# Altium footprint library Hare_Library.PcbLib: 252 footprints (part 1 of 16)
Each footprint in its own frame and in the unit in brackets; x right, y up, seen from the top. Pads: shape width x height; smd on the part's side, far side on the other; paste and mask are expansions set on the pad; w line width, h text height; cw(c..) or ccw(c..) is an arc to the next point about the centre after c.
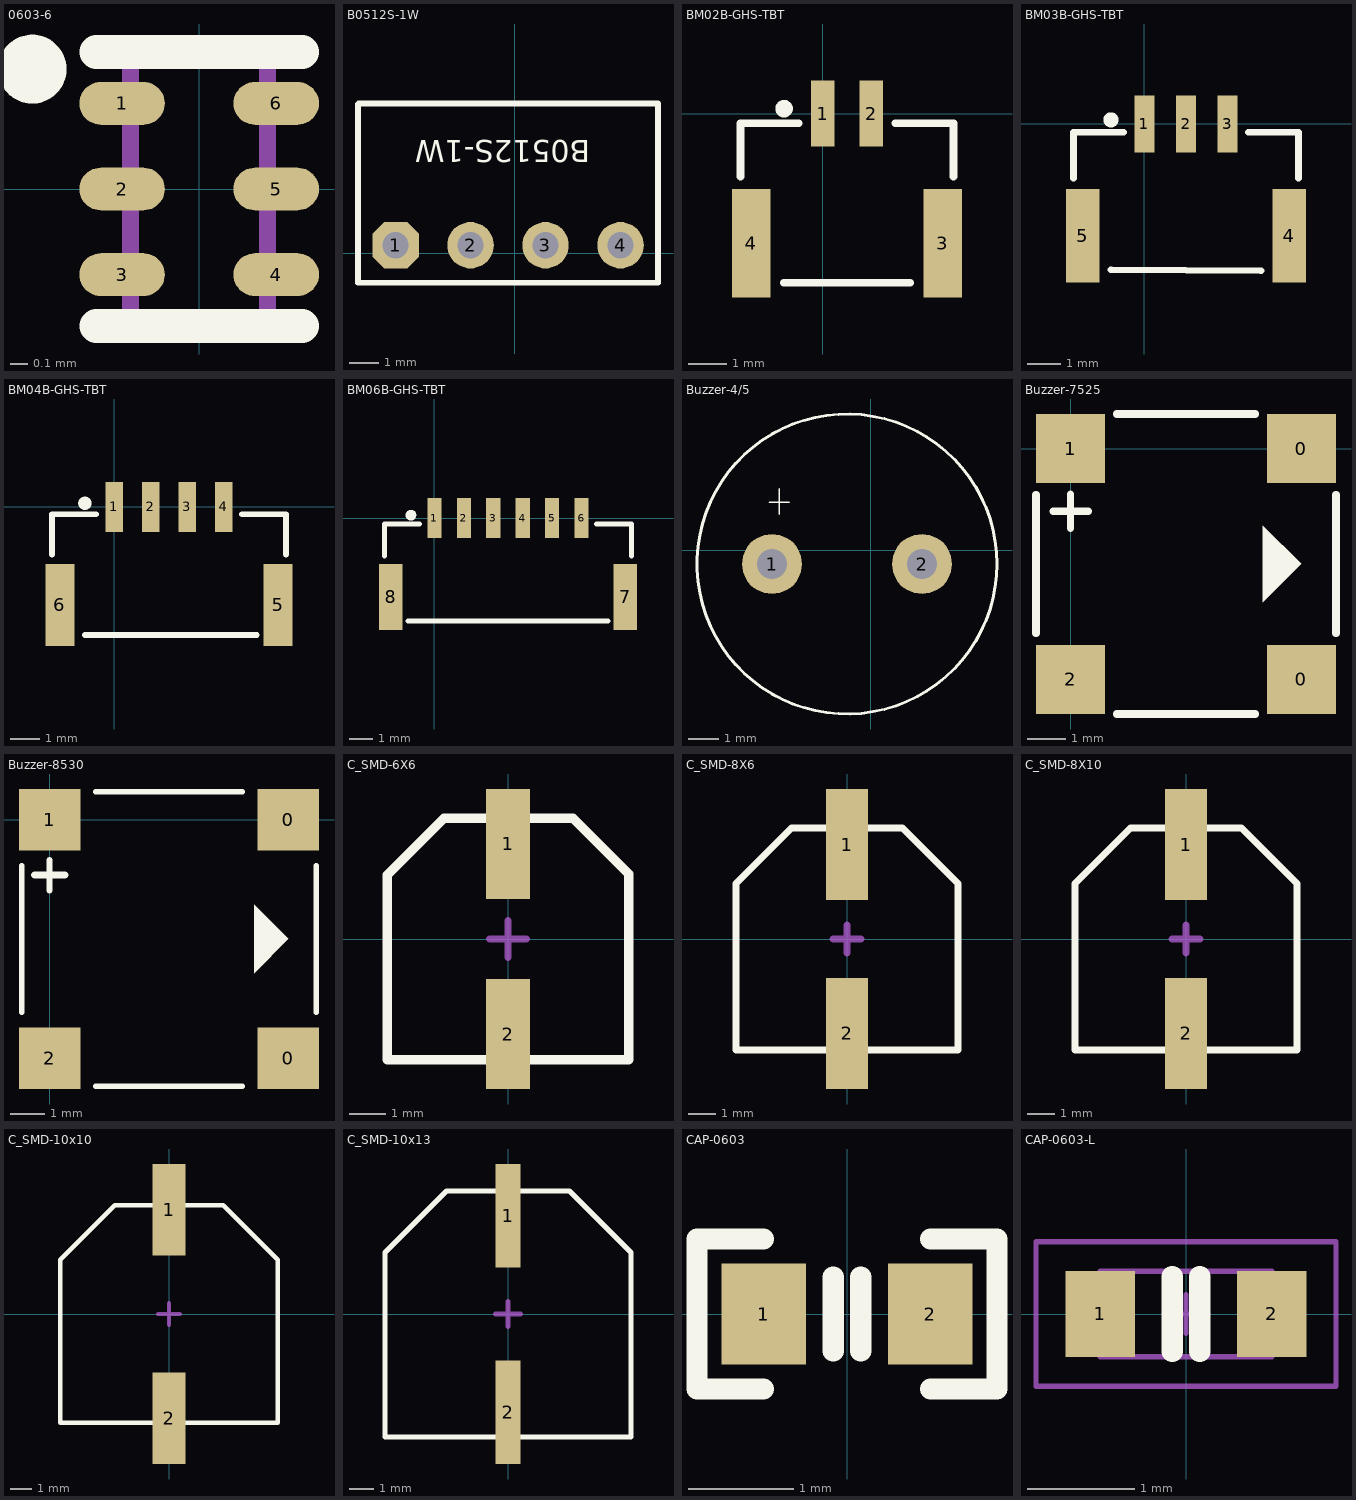
[diagram p0: the footprints below, top view; thin cyan lines are the x and y axes]

## 0603-6 [mm]
pads (6):
  oval 0.5x0.25 smd: 1(-0.45,0.5) 2(-0.45,0) 3(-0.45,-0.5) 4(0.45,-0.5) 5(0.45,0) 6(0.45,0.5)
Top Overlay:
  circle w0.25: c-0.976,0.7 r0.076
  lines w0.2: -0.6,-0.8 0.6,-0.8 ; -0.6,0.8 0.6,0.8
Mechanical 13:
  lines w0.1: -0.4,-0.8 -0.4,0.8 0.4,0.8 0.4,-0.8 -0.4,-0.8

## B0512S-1W [mil]
pads (4):
  oct 62x62 hole 35: 1(-159,11)
  round 62 hole 35: 2(-59,11) 3(41,11) 4(141,11)
Top Overlay:
  lines w7.87: -209,-39 -209,199 -208,200 191,200 191,-39
  lines w8: -209,-39 191,-39
  text "B0512S-1W" at 101,161 h50

## BM02B-GHS-TBT [mm] "GH02立式"
height 4.05
pads (4):
  rect 0.6x1.7 smd: 1(0,0) 2(1.25,0)
  rect 1x2.8 smd: 3(3.1,-3.35) 4(-1.85,-3.35)
Top Overlay:
  circle w0.254: c-1,0.125 r0.1
  lines w0.2: -2.125,-1.625 -2.125,-0.25 -0.625,-0.25 ; -1,-4.375 2.25,-4.375 ; 1.875,-0.25 3.375,-0.25 3.375,-1.625
3D body "BM02B-GHS-TBT.STEP": height 4.18, standoff -0.03, extent -2.25,-4.45 3.5,0.5

## BM03B-GHS-TBT [mm] "GH03立式"
height 4.05
pads (5):
  rect 0.6x1.7 smd: 1(0,0) 2(1.25,0) 3(2.5,0)
  rect 1x2.8 smd: 4(4.35,-3.35) 5(-1.85,-3.35)
Top Overlay:
  circle w0.254: c-1,0.125 r0.1
  lines w0.2: -2.125,-1.625 -2.125,-0.25 -0.625,-0.25 ; -1,-4.375 3.5,-4.4 ; 3.125,-0.25 4.625,-0.25 4.625,-1.625
3D body "BM03B-GHS-TBT.STEP": height 4.18, standoff -0.03, extent -2.25,-4.45 4.75,0.5

## BM04B-GHS-TBT [mm] "GH04立式"
height 4.05
pads (6):
  rect 0.6x1.7 smd: 1(0,0) 2(1.25,0) 3(2.5,0) 4(3.75,0)
  rect 1x2.8 smd: 5(5.6,-3.35) 6(-1.85,-3.35)
Top Overlay:
  circle w0.254: c-1,0.125 r0.1
  lines w0.2: -2.125,-1.625 -2.125,-0.25 -0.625,-0.25 ; -1,-4.375 4.875,-4.375 ; 4.375,-0.25 5.875,-0.25 5.875,-1.625
3D body "BM04B-GHS-TBT.STEP": height 4.18, standoff -0.03, extent -2.275,-4.45 5.975,0.5

## BM06B-GHS-TBT [mm] "GH06立式"
height 4.05
pads (8):
  rect 0.6x1.7 smd: 1(0,0) 2(1.25,0) 3(2.5,0) 4(3.75,0) 5(5,0) 6(6.25,0)
  rect 1x2.8 smd: 7(8.1,-3.35) 8(-1.85,-3.35)
Top Overlay:
  circle w0.254: c-1,0.125 r0.1
  lines w0.2: -2.125,-1.625 -2.125,-0.25 -0.625,-0.25 ; -1.132,-4.369 7.375,-4.375 ; 6.875,-0.25 8.375,-0.25 8.375,-1.625
3D body "BM06B-GHS-TBT.STEP": height 4.18, standoff -0.03, extent -2.256,-4.405 8.494,0.545

## Buzzer-4/5 [mm] "蜂鸣器（小）直插脚距4-5mm"
pads (2):
  round 2 hole 1: 1(-3.285,-0.455) 2(1.715,-0.455)
Top Overlay:
  circle w0.1: c-0.785,-0.455 r5
  lines w0.051: -3.377,1.603 -2.717,1.603 ; -3.047,1.196 -3.047,2.06
3D body "User Library-HCM1005.SLDPRT": height 5.88, standoff -3.62, extent -5.686,-5.508 4.314,4.492

## Buzzer-7525 [mm]
pads (4):
  rect 1.8x1.8 smd: 0(6,-6) 0(6,0) 1(0,0) 2(0,-6)
Top Overlay:
  region: 5,-2 5,-4 6,-3
  lines w0.178: 0,-2.077 0,-1.177
  lines w0.2: -0.9,-4.8 -0.9,-1.2 ; 1.2,-6.9 4.8,-6.9 ; 1.2,0.9 4.8,0.9 ; 6.9,-4.8 6.9,-1.2
  lines w0.203: -0.45,-1.627 0.45,-1.627
3D body "buzzer_7525.step": height 2.55, standoff 0.04, extent -0.75,-6.75 6.75,0.75

## Buzzer-8530 [mm]
pads (4):
  rect 1.8x1.8 smd: 0(7,-7) 0(7,0) 1(0,0) 2(0,-7)
Top Overlay:
  region: 6,-2.5 6,-4.5 7,-3.5
  lines w0.152: -0.818,-5.659 -0.818,-1.341 ; 1.341,-7.818 5.659,-7.818 ; 1.341,0.818 5.659,0.818 ; 7.818,-5.659 7.818,-1.341
  lines w0.178: 0,-2.077 0,-1.177
  lines w0.203: -0.45,-1.627 0.45,-1.627

## C_SMD-6X6 [mm]
pads (2):
  rect 1.2x3 smd: 1(0,2.6) 2(0,-2.6)
Top Overlay:
  lines w0.254: -3.3,-3.3 3.3,-3.3 3.3,1.775 1.775,3.3 -1.75,3.3 -3.3,1.75 -3.3,-3.3
Mechanical 15:
  lines w0.2: -0.5,0 0.5,0 ; 0,-0.5 0,0.5
3D body "User Library-CAP SMD SVP 6_3x5_9.STEP": height 5.9, standoff 0, extent -3.3,-3.65 3.3,3.65

## C_SMD-8X6 [mm]
pads (2):
  rect 1.5x4 smd: 1(0,3.4) 2(0,-3.4)
Top Overlay:
  lines w0.254: -4,-4 4,-4 4,2 2,4 -2,4 -4,2 -4,-4
Mechanical 15:
  lines w0.254: -0.5,0 0.5,0 ; 0,-0.5 0,0.5
3D body "User Library-CL_series_size8x6,2.STEP": height 6.2, standoff 0, extent -4.15,-4.45 4.15,4.45

## C_SMD-8X10 [mm]
pads (2):
  rect 1.5x4 smd: 1(0,3.4) 2(0,-3.4)
Top Overlay:
  lines w0.254: -4,-4 -4,2 -2,4 2,4 4,2 4,-4 -4,-4
Mechanical 15:
  lines w0.254: -0.5,0 0.5,0 ; 0,-0.5 0,0.5
3D body "User Library-CL_series_size8x10.STEP": height 10, standoff 0, extent -4.15,-4.5 4.15,4.4

## C_SMD-10x10 [mm]
pads (2):
  rect 1.5x4.2 smd: 1(0,4.8) 2(0,-4.8)
Top Overlay:
  lines w0.2: -5,-5 -5,2.5 -2.5,5 2.5,5 5,2.5 5,-5 -5,-5
Mechanical 15:
  lines w0.2: -0.5,0 0.5,0 ; 0,-0.5 0,0.5
3D body "User Library-cap_10x10x10-1.STEP": height -0.4, standoff -10.9, extent -5.25,-5.899 5.25,5.901

## C_SMD-10x13 [mm]
pads (2):
  rect 1x4.2 smd: 1(0,4) 2(0,-4)
Top Overlay:
  lines w0.2: -5,-5 5,-5 5,2.5 2.5,5 -2.5,5 -5,2.5 -5,-5
Mechanical 15:
  lines w0.2: -0.5,0 0.5,0 ; 0,-0.5 0,0.5
3D body "6.3V 820uF.stp": height 12.3, standoff -0.4, extent -5.15,-5.15 5.15,5.15

## CAP-0603 [mm]
pads (2):
  rect 0.8x0.96 smd: 1(-0.79,0) 2(0.79,0)
Top Overlay:
  lines w0.2: -0.79,-0.711 -1.422,-0.711 -1.422,0.711 -0.79,0.711 ; -0.13,-0.35 -0.13,0.35 ; 0.13,-0.35 0.13,0.35 ; 0.79,-0.711 1.422,-0.711 1.422,0.711 0.79,0.711
3D body "C_0603.STEP": height 0.9, standoff -0.01, extent -0.762,-0.391 0.762,0.391

## CAP-0603-L [mm]
pads (2):
  rect 0.65x0.8 smd: 1(-0.8,0) 2(0.8,0)
Top Overlay:
  lines w0.2: -0.13,-0.35 -0.13,0.35 ; 0.13,-0.35 0.13,0.35
Mechanical 13:
  lines w0.051: -0.203,0 0.203,0 ; 0,-0.178 0,0.178 ; -0.8,-0.4 0.8,-0.4 0.8,0.4 -0.8,0.4 -0.8,-0.4
Mechanical 14:
  lines w0.051: -1.4,-0.675 1.4,-0.675 1.4,0.675 -1.4,0.675 -1.4,-0.675
3D body "CAPC1608X08L.step": height 0.8, standoff 0, extent -0.8,-0.4 0.8,0.4